# Altium footprint library WR-TBL_Rising Cage Clamp.PcbLib: 435 footprints (part 2 of 28)
Each footprint in its own frame and in the unit in brackets; x right, y up, seen from the top. Pads: shape width x height; smd on the part's side, far side on the other; paste and mask are expansions set on the pad; w line width, h text height; cw(c..) or ccw(c..) is an arc to the next point about the centre after c.
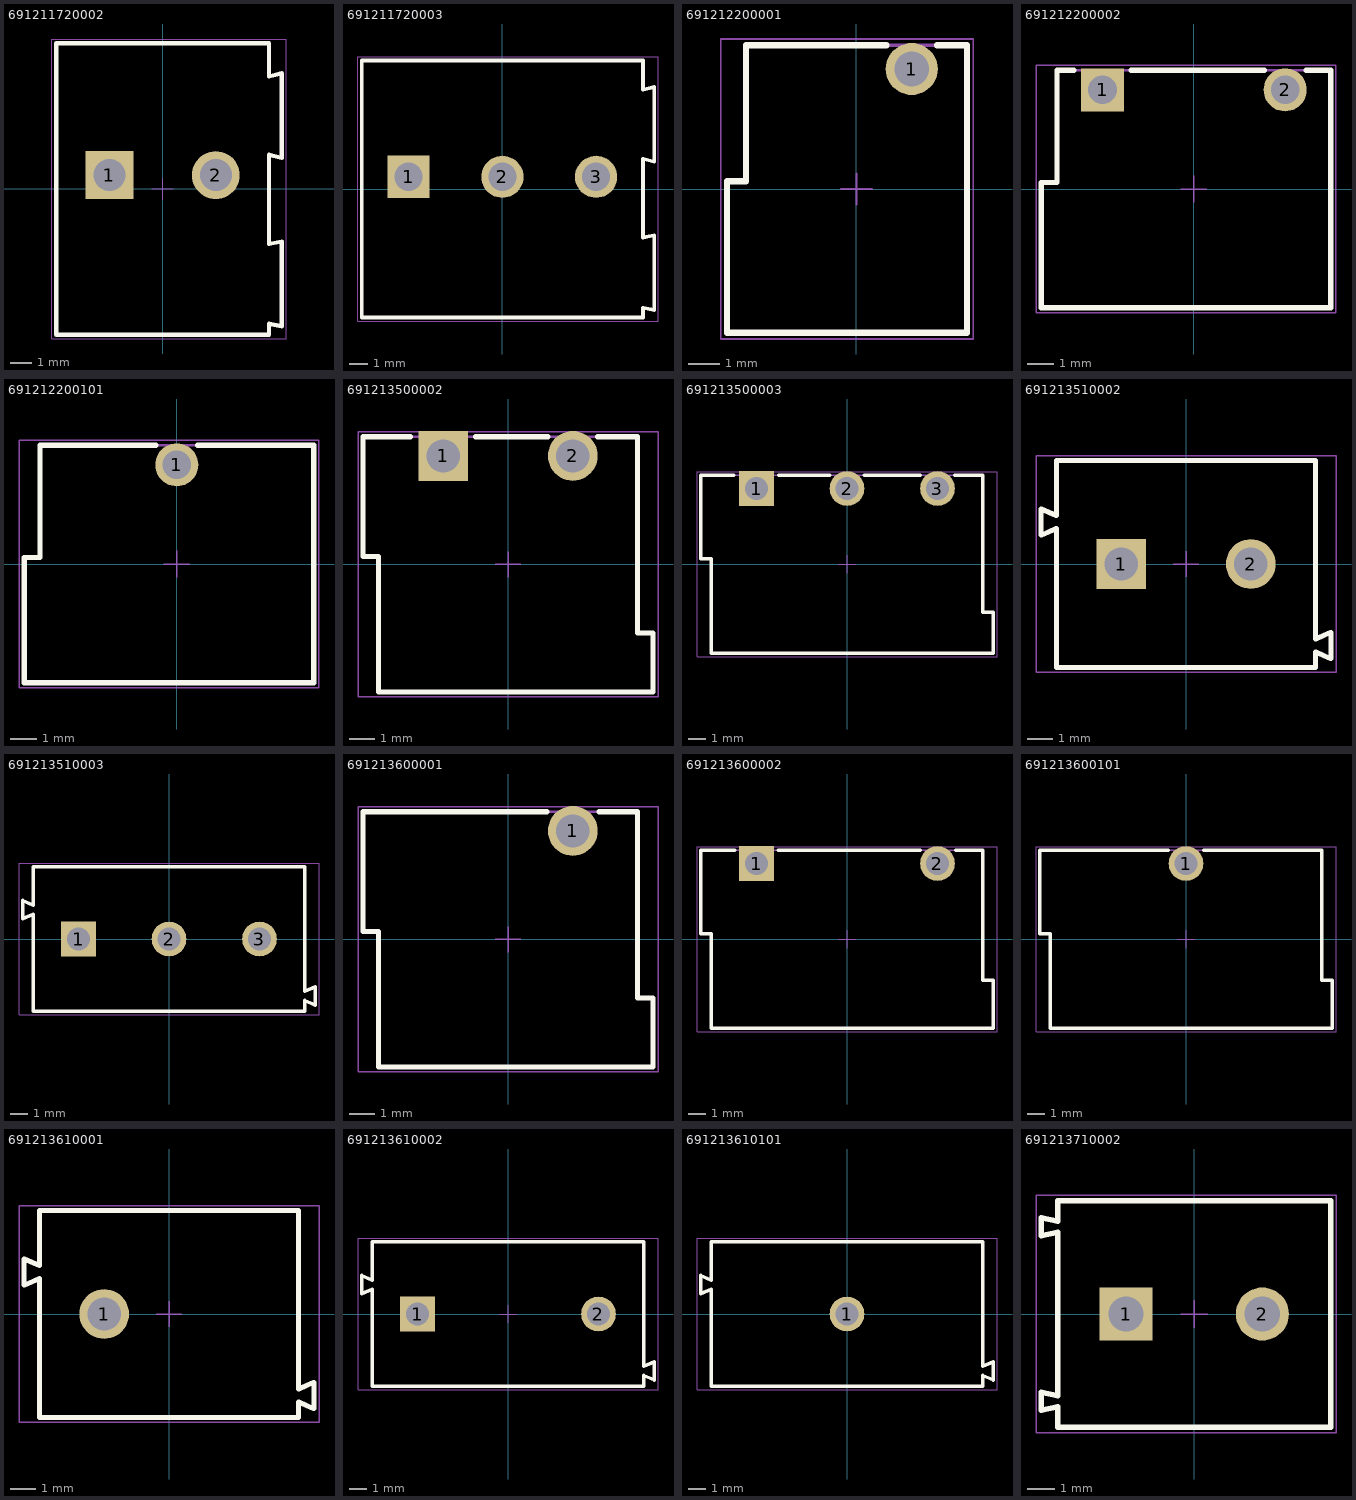
[diagram p1: the footprints below, top view; thin cyan lines are the x and y axes]

## 691211720002 [mm] "5,00mm - modular - green -45° entry with rising cage clamp - 02p"
height 15.5
pads (2):
  rect 2.25x2.25 hole 1.5: 1(-2.5,0.65)
  round 2.25 hole 1.5: 2(2.5,0.65)
Top Overlay:
  lines w0.2: -5,-6.85 5,-6.85 5,-6.33 5.6,-6.45 5.6,-2.47 5,-2.59 5,1.61 5.6,1.46 5.6,5.44 5,5.29 5,6.85 -5,6.85 -5,-6.85
Mechanical 13:
  lines w0.1: -5,-6.85 -5,6.85 5,6.85 5,5.29 5.6,5.44 5.6,1.46 5,1.61 5,-2.59 5.6,-2.47 5.6,-6.45 5,-6.33 5,-6.85 -5,-6.85
Mechanical 15:
  lines w0.05: -0.5,0 0.5,0 ; 0,-0.5 0,0.5 ; -5.2,-7.05 -5.2,7.05 5.8,7.05 5.8,-7.05 -5.2,-7.05
3D body "691211720002.stp": height 15.72, standoff -3.38, extent -5,-6.85 5.6,6.85

## 691211720003 [mm] "5,00mm - modular - green -45° entry with rising cage clamp - 03p"
height 15.5
pads (3):
  rect 2.25x2.25 hole 1.5: 1(-5,0.65)
  round 2.25 hole 1.5: 2(0,0.65) 3(5,0.65)
Top Overlay:
  lines w0.2: -7.5,-6.85 -7.5,6.85 7.5,6.85 7.5,5.29 8.1,5.44 8.1,1.46 7.5,1.61 7.5,-2.59 8.1,-2.47 8.1,-6.45 7.5,-6.33 7.5,-6.85 -7.5,-6.85
Mechanical 13:
  lines w0.1: -7.5,-6.85 7.5,-6.85 7.5,-6.33 8.1,-6.45 8.1,-2.47 7.5,-2.59 7.5,1.61 8.1,1.46 8.1,5.44 7.5,5.29 7.5,6.85 -7.5,6.85 -7.5,-6.85
Mechanical 15:
  lines w0.05: -0.5,0 0.5,0 ; 0,-0.5 0,0.5 ; -7.7,-7.05 8.3,-7.05 8.3,7.05 -7.7,7.05 -7.7,-7.05
3D body "691211720003.stp": height 15.72, standoff -3.38, extent -7.5,-6.85 8.1,6.85

## 691212200001 [mm] "7.00 mm Vertical Entry with Rising Cage Clamp, 1p"
height 7.3
pads (1):
  round 1.65 hole 1.1: 1(1.75,3.8)
Top Overlay:
  lines w0.2: 0.95,4.55 -3.5,4.55 -3.5,0.25 -4.1,0.25 -4.1,-4.55 3.5,-4.55 3.5,4.55 2.55,4.55
Mechanical 13:
  lines w0.1: -4.1,-4.55 -4.1,0.25 -3.5,0.25 -3.5,4.55 3.5,4.55 3.5,-4.55 -4.1,-4.55
Mechanical 15:
  lines w0.05: -0.5,0 0.5,0 ; 0,-0.5 0,0.5 ; -4.3,-4.75 3.7,-4.75 3.7,4.75 -4.3,4.75 -4.3,-4.75
3D body "691212200001.stp": height 7.33, standoff -3.47, extent -4.1,-4.55 3.5,4.55

## 691212200002 [mm] "7.00 mm Vertical Entry with Rising Cage Clamp, 2p"
height 7.3
pads (2):
  rect 1.65x1.65 hole 1.1: 1(-3.5,3.8)
  round 1.65 hole 1.1: 2(3.5,3.8)
Top Overlay:
  lines w0.2: -4.6,4.55 -5.25,4.55 -5.25,0.25 -5.85,0.25 -5.85,-4.55 5.25,-4.55 5.25,4.55 4.3,4.55 ; -2.4,4.55 2.7,4.55
Mechanical 13:
  lines w0.1: -5.85,-4.55 5.25,-4.55 5.25,4.55 -5.25,4.55 -5.25,0.25 -5.85,0.25 -5.85,-4.55
Mechanical 15:
  lines w0.05: -0.5,0 0.5,0 ; 0,-0.5 0,0.5 ; -6.05,-4.75 -6.05,4.75 5.45,4.75 5.45,-4.75 -6.05,-4.75
3D body "691212200002.stp": height 7.33, standoff -3.47, extent -5.85,-4.55 5.25,4.55

## 691212200101 [mm] "7.00 mm Vertical Entry with Rising Cage Clamp, 1p"
height 7.3
pads (1):
  round 1.65 hole 1.1: 1(0,3.8)
Top Overlay:
  lines w0.2: -0.8,4.55 -5.25,4.55 -5.25,0.25 -5.85,0.25 -5.85,-4.55 5.25,-4.55 5.25,4.55 0.8,4.55
Mechanical 13:
  lines w0.1: -5.85,-4.55 -5.85,0.25 -5.25,0.25 -5.25,4.55 5.25,4.55 5.25,-4.55 -5.85,-4.55
Mechanical 15:
  lines w0.05: -0.5,0 0.5,0 ; 0,-0.5 0,0.5 ; -6.05,-4.75 5.45,-4.75 5.45,4.75 -6.05,4.75 -6.05,-4.75
3D body "691212200101.stp": height 7.33, standoff -3.47, extent -5.85,-4.55 5.25,4.55

## 691213500002 [mm] "Serie 2135 - 5.08 mm _ 2 pins"
height 8.1
pads (2):
  rect 1.95x1.95 hole 1.3: 1(-2.54,4.25)
  round 1.95 hole 1.3: 2(2.54,4.25)
Top Overlay:
  lines w0.2: -3.83,5 -5.68,5 -5.68,0.3 -5.08,0.3 -5.08,-5 5.68,-5 5.68,-2.7 5.08,-2.7 5.08,5 3.51,5 ; -1.28,5 1.57,5
Mechanical 13:
  lines w0.1: -5.68,0.3 -5.68,5 5.08,5 5.08,-2.7 5.68,-2.7 5.68,-5 -5.08,-5 -5.08,0.3 -5.68,0.3
Mechanical 15:
  lines w0.05: -0.5,0 0.5,0 ; 0,-0.5 0,0.5 ; -5.88,-5.2 5.88,-5.2 5.88,5.2 -5.88,5.2 -5.88,-5.2
3D body "691213500002.stp": height 8.15, standoff -3.45, extent -5.68,-5 5.68,5

## 691213500003 [mm] "Serie 2135 - 5.08 mm_ 3 pins"
height 8.1
pads (3):
  rect 1.95x1.95 hole 1.3: 1(-5.08,4.25)
  round 1.95 hole 1.3: 2(0,4.25) 3(5.08,4.25)
Top Overlay:
  lines w0.2: -6.37,5 -8.22,5 -8.22,0.3 -7.62,0.3 -7.62,-5 8.22,-5 8.22,-2.7 7.62,-2.7 7.62,5 6.05,5 ; -3.82,5 -0.97,5 ; 0.97,5 4.1,5
Mechanical 13:
  lines w0.1: -8.22,0.3 -7.62,0.3 -7.62,-5 8.22,-5 8.22,-2.7 7.62,-2.7 7.62,5 -8.22,5 -8.22,0.3
Mechanical 15:
  lines w0.05: -0.5,0 0.5,0 ; 0,-0.5 0,0.5 ; -8.42,-5.2 -8.42,5.2 8.42,5.2 8.42,-5.2 -8.42,-5.2
3D body "691213500003.stp": height 8.15, standoff -3.45, extent -8.22,-5 8.22,5

## 691213510002 [mm] "Serie 2135 - 5.08 mm _ 2 pins"
height 10
pads (2):
  rect 1.95x1.95 hole 1.3: 1(-2.54,0)
  round 1.95 hole 1.3: 2(2.54,0)
Top Overlay:
  lines w0.2: -5.081,-4.019 -5.081,1.392 -5.68,1.13 -5.68,2.16 -5.081,1.898 ; -5.08,-4.05 5.08,-4.05 5.08,-3.45 5.68,-3.711 ; -5.08,1.9 -5.08,4.05 5.08,4.05 5.08,-2.941 5.68,-2.68 5.68,-3.71
Mechanical 13:
  lines w0.1: -5.081,-4.019 -5.081,1.392 -5.68,1.13 -5.68,2.16 -5.081,1.898 ; -5.08,-4.05 5.08,-4.05 5.08,-3.45 5.68,-3.711 ; -5.08,1.9 -5.08,4.05 5.08,4.05 5.08,-2.941 5.68,-2.68 5.68,-3.71
Mechanical 15:
  lines w0.05: -0.5,0 0.5,0 ; 0,-0.5 0,0.5 ; -5.88,-4.25 -5.88,4.25 5.88,4.25 5.88,-4.25 -5.88,-4.25
3D body "691213510002.stp": height 10.1, standoff -3.4, extent -5.68,-4.05 5.68,4.05

## 691213510003 [mm] "Serie 2135 - 5.08 mm _ 3 pins"
height 10
pads (3):
  rect 1.95x1.95 hole 1.3: 1(-5.08,0)
  round 1.95 hole 1.3: 2(0,0) 3(5.08,0)
Top Overlay:
  lines w0.2: -7.621,-4.019 -7.621,1.392 -8.22,1.13 -8.22,2.16 -7.621,1.898 ; -7.62,-4.05 7.62,-4.05 7.62,-3.45 8.22,-3.711 ; -7.62,1.9 -7.62,4.05 7.62,4.05 7.62,-2.941 8.22,-2.68 8.22,-3.71
Mechanical 13:
  lines w0.1: -7.621,-4.019 -7.621,1.392 -8.22,1.13 -8.22,2.16 -7.621,1.898 ; -7.62,-4.05 7.62,-4.05 7.62,-3.45 8.22,-3.711 ; -7.62,1.9 -7.62,4.05 7.62,4.05 7.62,-2.941 8.22,-2.68 8.22,-3.71
Mechanical 15:
  lines w0.05: -0.5,0 0.5,0 ; 0,-0.5 0,0.5 ; -8.42,-4.25 -8.42,4.25 8.42,4.25 8.42,-4.25 -8.42,-4.25
3D body "691213510003.stp": height 10.1, standoff -3.4, extent -8.22,-4.05 8.22,4.05

## 691213600001 [mm] "Vertical Cable Entry with Rising Clamp, pitch 10.16mm, 01p"
height 8
pads (1):
  round 1.95 hole 1.3: 1(2.54,4.25)
Top Overlay:
  lines w0.2: 1.52,5 -5.68,5 -5.68,0.3 -5.08,0.3 -5.08,-5 5.68,-5 5.68,-2.3 5.08,-2.3 5.08,5 3.57,5
Mechanical 13:
  lines w0.1: -5.68,0.3 -5.68,5 5.08,5 5.08,-2.3 5.68,-2.3 5.68,-5 -5.08,-5 -5.08,0.3 -5.68,0.3
Mechanical 15:
  lines w0.05: -0.5,0 0.5,0 ; 0,-0.5 0,0.5 ; -5.88,-5.2 -5.88,5.2 5.88,5.2 5.88,-5.2 -5.88,-5.2
3D body "691213600001.stp": height 8.2, standoff -3.4, extent -5.68,-5 5.68,5

## 691213600002 [mm] "Vertical Cable Entry with Rising Clamp, pitch 10.16mm, 02p"
height 8
pads (2):
  rect 1.95x1.95 hole 1.3: 1(-5.08,4.25)
  round 1.95 hole 1.3: 2(5.08,4.25)
Top Overlay:
  lines w0.2: -6.3,5 -8.22,5 -8.22,0.3 -7.62,0.3 -7.62,-5 8.22,-5 8.22,-2.3 7.62,-2.3 7.62,5 6.11,5 ; -3.86,5 4.1,5
Mechanical 13:
  lines w0.1: -8.22,0.3 -7.62,0.3 -7.62,-5 8.22,-5 8.22,-2.3 7.62,-2.3 7.62,5 -8.22,5 -8.22,0.3
Mechanical 15:
  lines w0.05: -0.5,0 0.5,0 ; 0,-0.5 0,0.5 ; -8.42,-5.2 8.42,-5.2 8.42,5.2 -8.42,5.2 -8.42,-5.2
3D body "691213600002.stp": height 8.2, standoff -3.4, extent -8.22,-5 8.22,5

## 691213600101 [mm] "Vertical Cable Entry with Rising Clamp, pitch 10.16mm, 01p"
height 8
pads (1):
  round 1.95 hole 1.3: 1(0,4.25)
Top Overlay:
  lines w0.2: -1,5 -8.22,5 -8.22,0.3 -7.62,0.3 -7.62,-5 8.22,-5 8.22,-2.3 7.62,-2.3 7.62,5 1,5
Mechanical 13:
  lines w0.1: -8.22,0.3 -8.22,5 7.62,5 7.62,-2.3 8.22,-2.3 8.22,-5 -7.62,-5 -7.62,0.3 -8.22,0.3
Mechanical 15:
  lines w0.05: -0.5,0 0.5,0 ; 0,-0.5 0,0.5 ; -8.42,-5.2 -8.42,5.2 8.42,5.2 8.42,-5.2 -8.42,-5.2
3D body "691213600101.stp": height 8.2, standoff -3.4, extent -8.22,-5 8.22,5

## 691213610001 [mm] "Horizontal Cable Entry with Rising Cage Clamp, pitch 10.16mm, 01p"
height 10
pads (1):
  round 1.95 hole 1.3: 1(-2.54,0)
Top Overlay:
  lines w0.2: -5.08,-4.05 5.08,-4.05 5.08,-3.45 5.68,-3.71 ; -5.079,-4.019 -5.079,1.389 -5.68,1.13 -5.68,2.16 -5.079,1.901 ; -5.08,1.9 -5.08,4.05 5.08,4.05 5.08,-2.94 5.68,-2.68 ; 5.68,-3.71 5.68,-2.68
Mechanical 13:
  lines w0.1: -5.08,-4.05 5.08,-4.05 5.08,-3.45 5.68,-3.71 ; -5.079,-4.019 -5.079,1.389 -5.68,1.13 -5.68,2.16 -5.079,1.901 ; -5.08,1.9 -5.08,4.05 5.08,4.05 5.08,-2.94 5.68,-2.68 ; 5.68,-3.71 5.68,-2.68
Mechanical 15:
  lines w0.05: -0.5,0 0.5,0 ; 0,-0.5 0,0.5 ; -5.88,-4.25 -5.88,4.25 5.88,4.25 5.88,-4.25 -5.88,-4.25
3D body "691213610001.stp": height 10.1, standoff -3.4, extent -5.68,-4.05 5.68,4.05

## 691213610002 [mm] "Horizontal Cable Entry with Rising Cage Clamp, pitch 10.16mm, 02p"
height 10
pads (2):
  rect 1.95x1.95 hole 1.3: 1(-5.08,0)
  round 1.95 hole 1.3: 2(5.08,0)
Top Overlay:
  lines w0.2: -7.62,-4.05 7.62,-4.05 7.62,-3.45 8.22,-3.71 ; -7.619,-4.019 -7.619,1.389 -8.22,1.13 -8.22,2.16 -7.619,1.901 ; -7.62,1.9 -7.62,4.05 7.62,4.05 7.62,-2.94 8.22,-2.68 ; 8.22,-3.71 8.22,-2.68
Mechanical 13:
  lines w0.1: -7.62,-4.05 7.62,-4.05 7.62,-3.45 8.22,-3.71 ; -7.619,-4.019 -7.619,1.389 -8.22,1.13 -8.22,2.16 -7.619,1.901 ; -7.62,1.9 -7.62,4.05 7.62,4.05 7.62,-2.94 8.22,-2.68 ; 8.22,-3.71 8.22,-2.68
Mechanical 15:
  lines w0.05: -0.5,0 0.5,0 ; 0,-0.5 0,0.5 ; -8.42,-4.25 8.42,-4.25 8.42,4.25 -8.42,4.25 -8.42,-4.25
3D body "691213610002.stp": height 10.1, standoff -3.4, extent -8.22,-4.05 8.22,4.05

## 691213610101 [mm] "Horizontal Cable Entry with Rising Cage Clamp, pitch 10.16mm, 01p"
height 10
pads (1):
  round 1.95 hole 1.3: 1(0,0)
Top Overlay:
  lines w0.2: -7.62,-4.05 7.62,-4.05 7.62,-3.45 8.22,-3.71 ; -7.619,-4.019 -7.619,1.389 -8.22,1.13 -8.22,2.16 -7.619,1.901 ; -7.62,1.9 -7.62,4.05 7.62,4.05 7.62,-2.94 8.22,-2.68 ; 8.22,-3.71 8.22,-2.68
Mechanical 13:
  lines w0.1: -7.62,-4.05 7.62,-4.05 7.62,-3.45 8.22,-3.71 ; -7.619,-4.019 -7.619,1.389 -8.22,1.13 -8.22,2.16 -7.619,1.901 ; -7.62,1.9 -7.62,4.05 7.62,4.05 7.62,-2.94 8.22,-2.68 ; 8.22,-3.71 8.22,-2.68
Mechanical 15:
  lines w0.05: -0.5,0 0.5,0 ; 0,-0.5 0,0.5 ; -8.42,-4.25 -8.42,4.25 8.42,4.25 8.42,-4.25 -8.42,-4.25
3D body "691213610101.stp": height 10.1, standoff -3.4, extent -8.22,-4.05 8.22,4.05

## 691213710002 [mm] "5,00mm - modular - green - Horizontal entry with rising cage clamp -  10,0mm height - 02p"
height 10
pads (2):
  rect 1.95x1.95 hole 1.3: 1(-2.5,0)
  round 1.95 hole 1.3: 2(2.5,0)
Top Overlay:
  lines w0.2: -5.6,-3.525 -5.6,-2.875 -5,-3 -5,3 -5.6,2.875 -5.6,3.525 -5,3.4 -5,4.15 5,4.15 5,-4.15 -5,-4.15 -5,-3.4 -5.6,-3.525
Mechanical 13:
  lines w0.1: -5.6,-3.525 -5,-3.4 -5,-4.15 5,-4.15 5,4.15 -5,4.15 -5,3.4 -5.6,3.525 -5.6,2.875 -5,3 -5,-3 -5.6,-2.875 -5.6,-3.525
Mechanical 15:
  lines w0.05: -0.5,0 0.5,0 ; 0,-0.5 0,0.5 ; -5.8,-4.35 5.2,-4.35 5.2,4.35 -5.8,4.35 -5.8,-4.35
3D body "691213710002.stp": height 10.05, standoff -3.75, extent -5.6,-4.15 5,4.15